# Altium schematic symbol library lib_datalogger.SchLib: 1246 symbols (part 12 of 16) (continued)
## CMP-019-000003-1
designator S?, comment SWITCH TOGGLE 3PST 24A 125V
Manufacturer: E-Switch; Manufacturer Part Number: ST34RE00; Actuator Length: 21.70mm; Illumination: Non-Illuminated; Electrical Life: 6,000 Cycles; Bushing Thread: M12 x 1; Actuator Type: Standard Round; Current Rating: 24A (AC); Actuator Material: Brass, Nickel Plated; Switch Function: On-Off; Mounting Type: Panel Mount; Panel Cutout Dimensions: Circular - 12.00mm Dia; Pricing: 1=8.21, 10=7.992, 25=7.776, 50=7.344, 100=7.128, 250=6.912, 500=5.832, 1000=5.616 (USD); Illumination Type, Color: -; ComponentLink1Description: http://spec_sheets.e-switch.com/specs/34-ST34RE00.pdf; Voltage Rating - AC: 125V; Packaging: Bulk; Category: Switches; Illumination Voltage (Nominal): -; Design Item ID: SWITCH TOGGLE 3PST 24A 125V; Operating Temperature: -20°C ~ 85°C; Features: -; Stock: 1344; Source: mits.SchLib; Voltage Rating - DC: -; Circuit: 3PST; RoHS: RoHS Compliant; ComponentLink1URL: http://spec_sheets.e-switch.com/specs/34-ST34RE00.pdf; Part Status: Active; Ingress Protection: -; Termination Style: Quick Connect - 0.250" (6.3mm)
footprint SWITCH_TOGGLE_3PST_HOLES
footprint SWITCH_TOGGLE_3PST_HOLES
pins: 1, 2, 4, 5, 7, 8

## CMP-019-00003-3
designator U?, comment CAT24C32WI-GT3
I2C CMOS Serial EEPROM, 32 Kb, 1.7 to 5.5 V, -40 to 85 degC, 8-Pin SOIC (751BD), RoHS, Tape and Reel; Manufacturer: ON Semiconductor; Nominal Supply Current: 2mA; Access Time: 3500ns; Clock Frequency: 100kHz; Density: 32Kb; Max Supply Voltage: 5.5V; Frequency: 400kHz; Min Supply Voltage: 1.7V; Package URL: http://www.onsemi.com/pub_link/Collateral/751BD.PDF; Max Operating Temperature: 85°C; Pins: 8; Min Operating Temperature: -40°C; Datasheet URL: http://www.onsemi.com/pub_link/Collateral/CAT24C32-D.PDF; Manufacturer URL: http://www.onsemi.com/; Interface: Serial; Datasheet Version: Rev. 24, 06/2015; RoHS Compliant: True; Max Clock Frequency: 100KHz; Mounting Technology: SM; Package Description: 8-Pin Small Outline Integrated Circuit, Body 4.9 x 3.9 mm, Pitch 1.27 mm; Case/Package: SOIC; Package Reference: SOIC-8-751BD-01; Packaging: TapeandReel; Package Quantity: 3000
footprint ONSC-SOIC-8-751BD-01_L (SOIC, 8-Leads, Body 5x4mm, Pitch 1.27mm, IPC High Density)
footprint ONSC-SOIC-8-751BD-01_N (SOIC, 8-Leads, Body 5x4mm, Pitch 1.27mm, IPC Medium Density)
footprint ONSC-SOIC-8-751BD-01_M (SOIC, 8-Leads, Body 5x4mm, Pitch 1.27mm, IPC Low Density)
pins: 1 A0 (in) "Device Address", 2 A1 (in) "Device Address", 3 A2 (in) "Device Address", 4 VSS (power) "Ground", 5 SDA (io) "Serial Data", 6 SCL (in) "Serial Clock", 7 WP (in) "Write Protect", 8 VCC (power) "Power Supply"

## CMP-019-000004-1
designator S?, comment SWITCH PUSH SPST-NO 1A 120V TH
SWITCH PUSH SPST-NO 1A 120V; Manufacturer Part Number: 800AWSP9M2QE; Manufacturer: E-Switch; Electrical Life: 50,000 Cycles; Color - Actuator/Cap: Black; Ingress Protection: IP67 - Dust Tight, Waterproof; Actuator Type: Round, Plunger; Current Rating: 1A (AC); Switch Function: Off-Mom; Panel Cutout Dimensions: -; Category: Switches; Source: mits.SchLib; Design Item ID: SWITCH PUSH SPST-NO 1A 120V TH; Illumination Voltage (Nominal): -; Operating Temperature: -30°C ~ 85°C; Mounting Type: Through Hole; Voltage Rating - AC: 120V; Stock 1: 6565; ComponentLink1Description: http://spec_sheets.e-switch.com/specs/T833053.pdf; Voltage Rating - DC: -; Termination Style: PC Pin; Pricing 1: 1=2.98, 10=2.778, 25=2.646, 50=2.5138, 100=2.4476, 250=2.3814, 500=2.2491, 1000=2.1168, 5000=1.78605 (USD); RoHS: RoHS Compliant; Circuit: SPST-NO; Illumination Type, Color: -; Features: Epoxy Sealed Terminals; Type: Standard; Mechanical Life: -; ComponentLink1URL: http://spec_sheets.e-switch.com/specs/T833053.pdf; Part Status: Active; Packaging: Bulk
footprint SWITCH_PUSH_TH
footprint SWITCH_PUSH_TH
pins: 1, 2

## CMP-019-00004-3
designator U?, comment S25FL204k0TMFI011
SPI Flash Memory, 2.7 to 3.6 V, -40 to 85 degC, 8-Pin SOIC (SOC 008), RoHS, Tube; Manufacturer: Cypress; Datasheet URL: http://www.cypress.com/file/196871/download; Package Reference: SOIC-8; Datasheet Version: Rev. *G , 09/2015; Package Description: 8-Pin Small Outline Integrated Circuit, Body 5.283 x 5.283 mm, Pitch 1.27 mm; RoHS Compliant: True; Mounting Technology: SM; Manufacturer URL: http://www.cypress.com/; Case/Package: SOIC-8
footprint CYP-SOC-8_N (SOIC, 8-Leads, Body 5.3x5.3mm, Pitch 1.27mm, IPC Medium Density)
footprint CYP-SOC-8_M (SOIC, 8-Leads, Body 5.3x5.3mm, Pitch 1.27mm, IPC Low Density)
footprint CYP-SOC-8_L (SOIC, 8-Leads, Body 5.3x5.3mm, Pitch 1.27mm, IPC High Density)
pins: 1 CS# (in) "Chip Enable", 2 SO (hiz) "Serial Data Output", 3 WP# (in) "Write Protect", 4 GND (power) "Ground", 5 SI/IO0 (io) "Serial Data Input / Output", 6 SCK (in) "Serial Clock Input", 7 HOLD# (in) "Hold Input", 8 VCC (power) "Supply Voltage (2.7-3.6V)"

## CMP-019-000005-1
designator S?, comment SWITCH ROCKER SPST 20A 250V TH
SWITCH ROCKER SPST 20A 250V; Manufacturer Part Number: C1300ARBB-602AW; Manufacturer: Bulgin; Voltage Rating - DC: 24V; Current Rating: 20; Color - Actuator/Cap: Black; Switch Function: On-Off; Actuator Marking: O -; Actuator Type: Concave (Curved); Stock 1: 11242; Features: -; RoHS: RoHS Compliant; Part Status: Active; Electrical Life: -; Mounting Type: Panel Mount, Snap-In; Illumination Voltage (Nominal): -; Design Item ID: SWITCH ROCKER SPST 20A 250V TH; Mechanical Life: -; ComponentLink1URL: http://www.bulgin.com/media/bulgin/data/A_Rocker%201500%201300.pdf; Packaging: Bulk; Source: mits.SchLib; Termination Style: Quick Connect - 0.250" (6.3mm); ComponentLink1Description: http://www.bulgin.com/media/bulgin/data/A_Rocker%201500%201300.pdf; Operating Temperature: -; Category: Switches; Voltage Rating - AC: 250V; Ingress Protection: -; Pricing 1: 1=2.58, 10=2.471, 25=2.3584, 50=2.246, 100=2.1337, 250=2.07756, 500=1.96526, 1000=1.74065, 5000=1.6845 (USD); Circuit: SPST; Panel Cutout Dimensions: Rectangular - 28.60mm x 14.10mm; Illumination Type, Color: -
footprint SWITCH_TOGGLE_TH
footprint ROCKER_HOLES
pins: 1, 2

## CMP-019-00005-3
designator C?, comment L7805ACD2T-TR
Positive Voltage Regulator IC, 5 V, 1.5 A, 0 to 125 degC, 3-Pin D2PAK, RoHS, Tape and Reel; Manufacturer: STMicroelectronics; Package Version: Rev. 1, 11/2014; Min Input Voltage: 7V; Max Ouput Current: 1A; Max Input Voltage: 35V; Output Current: 1.5A; Output Voltage: 5V; Dropout Voltage: 2V; Outputs: 1; Max Supply Voltage: 20V; Min Supply Voltage: 7.5V; Min Operating Temperature: 0°C; RoHS Compliant: True; Package Reference: D2PAK; Mounting Technology: SM; Packaging: TapeandReel; Case/Package: TO-263-3; Manufacturer URL: http://www.st.com/; Pins: 8; Max Operating Temperature: 125°C; Package URL: http://www.st.com/st-web-ui/static/active/en/resource/technical/document/datasheet/DM00122355.pdf; Datasheet URL: http://www.st.com/content/ccc/resource/technical/document/datasheet/41/4f/b3/b0/12/d4/47/88/CD00000444.pdf/files/CD00000444.pdf/jcr:content/translations/en.CD00000444.pdf; Package Quantity: 1000; Package Description: 3-Pin D2PAK, Body 10.2 x 9.15 mm, Pitch 2.54 mm; Datasheet Version: Rev. 34, 11/2016; Nominal Output Voltage: 5V
footprint STM-D2PAK_V (DPAK, 3-Leads, Body 10.2x9.15mm, Pitch 2.54mm)
pins: 1, 2

## CMP-019-000006-1
designator SW?, comment SWITCH ROCKER SPST 20A 250V PANEL  (no BOM)
SWITCH ROCKER SPST 20A 250V; Manufacturer Part Number: C1300ARBB-602AW; Manufacturer: Bulgin; Actuator Marking: O -; Current Rating: 20; Actuator Type: Concave (Curved); Switch Function: On-Off; Color - Actuator/Cap: Black; Voltage Rating - DC: 24V; Packaging: Bulk; Source: mits.SchLib; Part Status: Active; Pricing 1: 1=2.58, 10=2.471, 25=2.3584, 50=2.246, 100=2.1337, 250=2.07756, 500=1.96526, 1000=1.74065, 5000=1.6845 (USD); Category: Switches; Stock 1: 11242; ComponentLink1Description: http://www.bulgin.com/media/bulgin/data/A_Rocker%201500%201300.pdf; Mechanical Life: -; Termination Style: Quick Connect - 0.250" (6.3mm); Ingress Protection: -; Electrical Life: -; Illumination Type, Color: -; RoHS: RoHS Compliant; Circuit: SPST; Design Item ID: SWITCH ROCKER SPST 20A 250V PANEL; Mounting Type: Panel Mount, Snap-In; ComponentLink1URL: http://www.bulgin.com/media/bulgin/data/A_Rocker%201500%201300.pdf; Illumination Voltage (Nominal): -; Features: -; Operating Temperature: -; Panel Cutout Dimensions: Rectangular - 28.60mm x 14.10mm; Voltage Rating - AC: 250V
footprint ROCKER_SWITCH
footprint ROCKER_SWITCH

## CMP-019-00006-3
designator U?, comment LD1117S50TR
Fixed Low Drop Positive Voltage Regulator, 5 V, 0 to 125 degC, 4-Pin SOT223, RoHS, Tape and Reel; Manufacturer: STMicroelectronics; Max Input Voltage: 15V; Min Supply Voltage: 6.5V; Max Ouput Current: 1.3A; Output Voltage: 5V; Output Current: 950mA; Dropout Voltage: 1.1V; Power: 12W; Outputs: 1; Packaging: TapeandReel; Datasheet URL: http://www.st.com/content/ccc/resource/technical/document/datasheet/99/3b/7d/91/91/51/4b/be/CD00000544.pdf/files/CD00000544.pdf/jcr:content/translations/en.CD00000544.pdf; Package Reference: SOT-223; RoHS Compliant: True; Datasheet Version: Nov-13; Min Operating Temperature: 0°C; Case/Package: TO-261-4; Pins: 4; Manufacturer URL: http://www.st.com/; Mounting Technology: SM; Package Quantity: 2500; Nominal Output Voltage: 5V; Max Supply Voltage: 15V; Min Input Voltage: 6.5V; Max Operating Temperature: 125°C; Package Description: 4-Pin Small Outline Transistor, Body 6.5 x 3.5 mm, Pitch 2.3 mm
footprint STM-SOT-223_N (SOT223, 4-Leads, Body 6.7x3.7mm, Pitch 2.3mm, IPC Medium Density)
footprint STM-SOT-223_L (SOT223, 4-Leads, Body 6.7x3.7mm, Pitch 2.3mm, IPC High Density)
footprint STM-SOT-223_M (SOT223, 4-Leads, Body 6.7x3.7mm, Pitch 2.3mm, IPC Low Density)
pins: 1 GND (power), 2 VOUT (power), 3 VIN (power), 4 TAB (power)

## CMP-019-000007-1
designator S?, comment SWITCH ROTARY 3POS 350MA 125V TH
SWITCH ROTARY 3POS 350MA 125V; Manufacturer Part Number: KC56A13.001NPF; Manufacturer: E-Switch; Current Rating: 350mA (AC); Number of Poles per Deck: 1; Number of Positions: 3; Actuator Type: Flatted (6.35mm Dia); Operating Force, Torque: 800 g-cm; Contact Timing: Non-Shorting (BBM); Circuit per Deck: SP3T; Angle of Throw: 90°; Index Stops: Fixed; Actuator Length: 13.00mm; Termination Style: PC Pin; Contact Material: Copper Alloy; Design Item ID: SWITCH ROTARY 3POS 350MA 125V TH; ComponentLink1Description: http://spec_sheets.e-switch.com/specs/G511001.pdf; Number of Decks: 1; Pricing 1: 1=6.59, 10=5.442, 25=5.37, 50=4.9404, 100=4.7256, 250=4.2244, 500=4.1528, 1000=4.0812 (USD); Part Status: Active; ComponentLink1URL: http://spec_sheets.e-switch.com/specs/G511001.pdf; Stock 1: 72; Category: Switches; Mounting Type: Panel Mount, Through Hole; Contact Finish: Gold; Voltage Rating - DC: -; Voltage Rating - AC: 125V; Source: mits.SchLib; Features: -; Depth Behind Panel: 14.20mm; Panel Cutout Dimensions: Circular - 9.80mm Dia; RoHS: RoHS Compliant
footprint ROTARY_SWITCH_SP3T
footprint ROTARY_SWITCH_SP3T
pins: 1, 4 2, 7 3, A COM
1 alternate drawing of the same symbol

## CMP-019-00007-3
designator U?, comment LM2576HVS-5.0/NOPB
SIMPLE SWITCHER(R) Step-Down Regulator, 5 V, 3 A, -40 to 125 degC, 5-Pin TO-263 (TKK), Pb-Free (RoHS Exempt), Tube; Manufacturer: Texas Instruments; Output Current: 3A; Max Supply Voltage: 60V; Efficiency: 77%; Frequency: 58kHz; Min Supply Voltage: 4V; Outputs: 1; Output Voltage: 5V; Mounting Technology: SM; Package Description: 5-Pin Surface Mount Device, Body 10.225 x 9.91 mm, Pitch 1.7 mm; Datasheet URL: http://www.ti.com/lit/ds/symlink/lm2576hv.pdf; Max Operating Temperature: 125°C; Min Operating Temperature: -40°C; Packaging: Rail/Tube; Case/Package: TO-263-5; Max Input Voltage: 60V; Max Ouput Current: 3A; Switching Frequency: 58KHz; Package Quantity: 45; Package Reference: KTT0005B; Min Input Voltage: 4V; Datasheet Version: SNVS107D, 05/2016; Pins: 5; Manufacturer URL: http://www.ti.com/; RoHS Compliant: True
footprint KTT0005B_M (DPAK, 5-Leads, Body 10.65x9.65mm, Pitch 1.7mm, IPC Low Density)
footprint KTT0005B_N (DPAK, 5-Leads, Body 10.65x9.65mm, Pitch 1.7mm, IPC Medium Density)
footprint KTT0005B_L (DPAK, 5-Leads, Body 10.65x9.65mm, Pitch 1.7mm, IPC High Density)
pins: 1 VIN (power) "Supply input pin to collector pin of high-side transistor. Connect to power supply and input bypass capacitors CIN. Path from VIN pin to high frequency bypass CIN and GND must be as short as possible.", 2 OUTPUT (power) "Emitter pin of the power transistor. This is a switching node. Attached this pin to an inductor and the cathode of the external diode.", 3 GROUND (power) "Ground pin. Path to CIN must be as short as possible.", 4 FEEDBACK (in) "Feedback sense input pin. Connect to the midpoint of feedback divider to set VOUT for ADJ version or connect this pin directly to the output capacitor for a fixed output version.", 5 ~{ON}/OFF (in) "Enable input to the voltage regulator. High = OFF and low = ON. Connect to GND to enable the voltage regulator. Do not leave this pin float.", 6 TAB (power) "Connected to GND. Put a copper plane connected to this pin as a thermal relief for DDPAK package."

## CMP-019-000008-1
designator S?, comment SWITCH ROTARY 5POS 350MA 125V TH
SWITCH ROTARY 5POS 350MA 125V; Manufacturer: E-Switch; Manufacturer Part Number: KC15A9.501NPF; Current Rating: 350mA (AC); Contact Timing: Non-Shorting (BBM); Number of Poles per Deck: 1; Operating Force, Torque: 800 g-cm; Actuator Length: 9.50mm; Circuit per Deck: SP5T; Number of Positions: 5; Index Stops: Fixed; Angle of Throw: 30°; Actuator Type: Flatted (6.35mm Dia); Voltage Rating - DC: -; ComponentLink1Description: http://spec_sheets.e-switch.com/specs/G510602.pdf; Features: -; Stock 1: 866; Source: mits.SchLib; ComponentLink1URL: http://spec_sheets.e-switch.com/specs/G510602.pdf; Mounting Type: Panel Mount, Through Hole; Contact Finish: Gold; Design Item ID: SWITCH ROTARY 5POS 350MA 125V TH; Termination Style: PC Pin; Pricing 1: 1=6.59, 10=5.442, 25=5.37, 50=4.9404, 100=4.7256, 250=4.2244, 500=4.1528, 1000=4.0812 (USD); Panel Cutout Dimensions: Circular - 9.80mm Dia; Contact Material: Copper Alloy; Depth Behind Panel: 14.20mm; Number of Decks: 1; Category: Switches; Voltage Rating - AC: 125V; RoHS: RoHS Compliant; Part Status: Active
footprint ROTARY_SWITCH_SP5T
footprint ROTARY_SWITCH_SP5T
pins: 1, 2, 3, 4, 5, A COM
1 alternate drawing of the same symbol

## CMP-019-00008-3
designator U?, comment LMS8117AMP-3.3/NOPB
Low-Dropout Linear Regulator, 1 A, 3.3 V, 0 to 125 degC, 4-Pin SOT223 (DCY), RoHS, Tape and Reel; Manufacturer: Texas Instruments; Min Input Voltage: 2.5V; Min Supply Voltage: 3.2V; Max Supply Voltage: 15V; Outputs: 1; Output Current: 1A; Nominal Supply Current: 5mA; Dropout Voltage: 1.2V; Output Voltage: 3.3V; Datasheet URL: http://www.ti.com/lit/ds/symlink/lms8117a.pdf; Manufacturer URL: http://www.ti.com/; Package Reference: DCY0004A; Max Operating Temperature: 125°C; Datasheet Version: SNOS487F, 05/2004; Max Input Voltage: 15V; Mounting Technology: SM; Package Description: 4-Pin Small Outline Transistor, Body 6.5 x 3.5 mm, Pitch 2.3 mm; Pins: 4; Package Quantity: 1000; Packaging: TapeandReel; RoHS Compliant: True; Min Operating Temperature: 0°C; Case/Package: SOT-223; Max Ouput Current: 1A
footprint DCY0004A_M (SOT223, 4-Leads, Body 6.7x3.7mm, Pitch 2.3mm, IPC Low Density)
footprint DCY0004A_L (SOT223, 4-Leads, Body 6.5x3.5mm, Pitch 2.3mm, IPC High Density)
footprint DCY0004A_N (SOT223, 4-Leads, Body 6.7x3.7mm, Pitch 2.3mm, IPC Medium Density)
pins: 1 GND (power) "Ground pin for fixed output option.", 2 VOUT (power) "Output voltage pin for the regulator", 3 VIN (power) "Input voltage pin for the regulator", 4 VOUT (power) "Output voltage pin for the regulator"

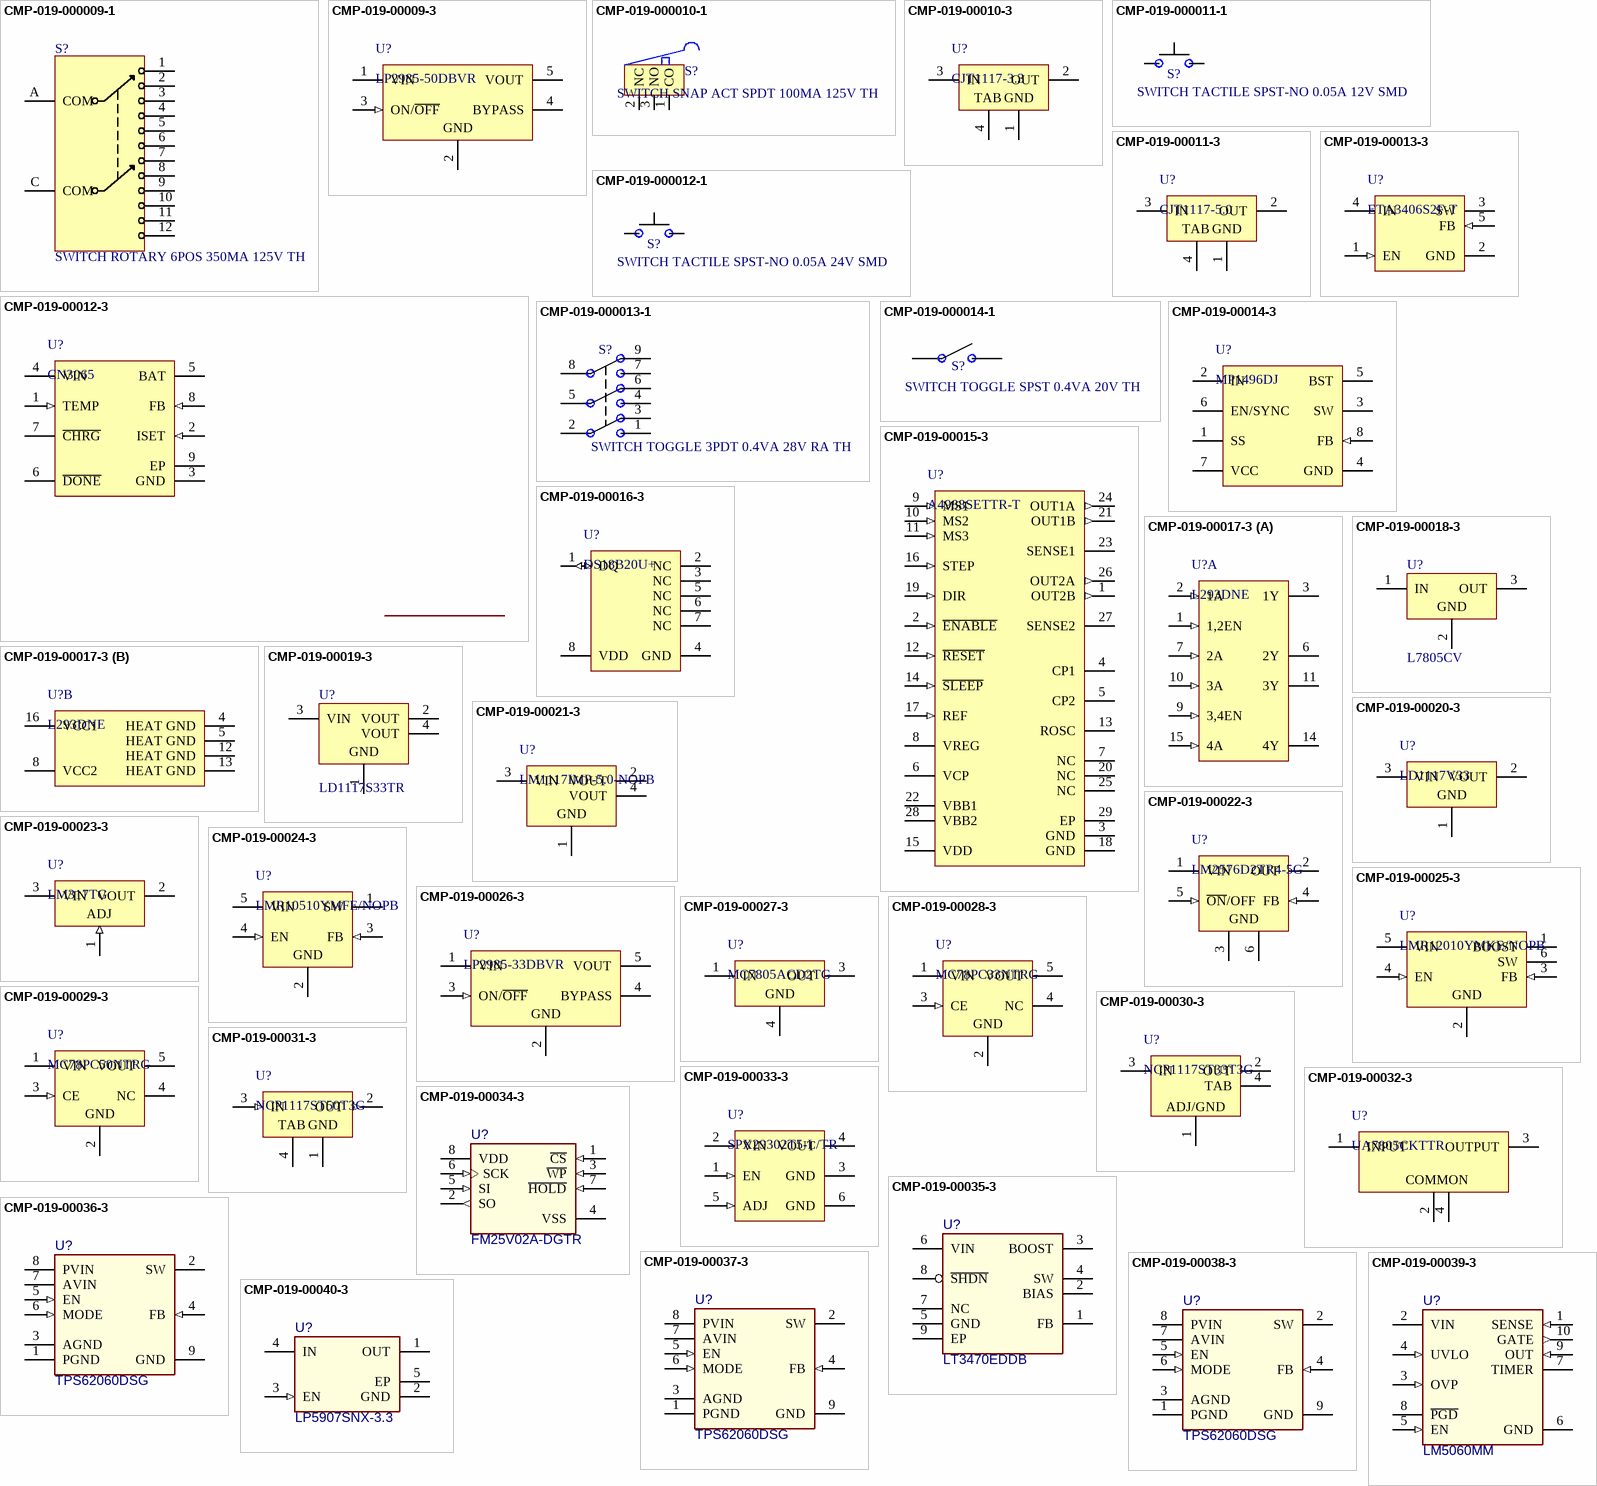
[diagram p35: symbols CMP-019-000009-1 to CMP-019-00040-3]

## CMP-019-000009-1
designator S?, comment SWITCH ROTARY 6POS 350MA 125V TH
SWITCH ROTARY 6POS 350MA 125V; Manufacturer Part Number: KC26A9.501NLS; Manufacturer: E-Switch; Number of Decks: 1; Actuator Length: 9.50mm; Actuator Type: Flatted (6.35mm Dia); Contact Timing: Non-Shorting (BBM); Angle of Throw: 30°; Circuit per Deck: DP6T; Current Rating: 350mA (AC); Index Stops: Fixed; Number of Positions: 6; Number of Poles per Deck: 2; Operating Force, Torque: 800 g-cm; Source: mits.SchLib; Stock 1: 1329; Contact Finish: Silver; RoHS: RoHS Compliant; Features: -; Voltage Rating - AC: 125V; Depth Behind Panel: 18.50mm; Panel Cutout Dimensions: Circular - 9.80mm Dia; ComponentLink1Description: http://spec_sheets.e-switch.com/specs/G523729.pdf; Termination Style: Solder Lug; Mounting Type: Panel Mount; Design Item ID: SWITCH ROTARY 6POS 350MA 125V TH; ComponentLink1URL: http://spec_sheets.e-switch.com/specs/G523729.pdf; Part Status: Active; Category: Switches; Voltage Rating - DC: -; Contact Material: Copper Alloy; Pricing 1: 1=5.5, 10=5.269, 25=4.8112, 50=4.582, 100=4.1238, 250=3.78016, 500=3.6656, 1000=3.55105 (USD)
footprint ROTARY_SWITCH_DP6T
footprint ROTARY_SWITCH_DP6T
pins: 1, 2, 3, 4, 5, 6, 7, 8, 9, 10, 11, 12, A COM, C COM
1 alternate drawing of the same symbol

## CMP-019-00009-3
designator U?, comment LP2985-50DBVR
Low-Noise Low-Dropout Regulator with Shutdown, 150 mA, Fixed 5 V Output, 2.2 to 16 V Input, 5-Pin SOT-23 (DBV), -40 to 125 degC, Green (RoHS & no Sb/Br), Tape and Reel; Manufacturer: Texas Instruments; Outputs: 1; Nominal Output Voltage: 5V; Min Input Voltage: 2.2V; Output Current: 150mA; Max Input Voltage: 16V; Dropout Voltage: 280mV; Manufacturer URL: http://www.ti.com/; Package Description: 5-Pin Small Outline Transistor, Body 2.9 x 1.6 mm, Pitch 0.95 mm; Min Operating Temperature: -40°C; Package URL: http://www.ti.com/lit/ml/mpds018l/mpds018l.pdf; Package Quantity: 1; Datasheet URL: http://www.ti.com/lit/ds/symlink/lp2985.pdf; Pins: 8; Datasheet Version: SLVS522O, 01/2015; Package Reference: DBV0005A; Case/Package: SOT-23-5; Max Operating Temperature: 125°C; Mounting Technology: SM; Output Voltage: 5V; RoHS Compliant: True; Max Ouput Current: 150mA; Packaging: TapeandReel
footprint DBV0005A_M (SOT23, 5-Leads, Body 3.05x1.75mm, Pitch 0.95mm, IPC Low Density)
footprint DBV0005A_N (SOT23, 5-Leads, Body 3.05x1.75mm, Pitch 0.95mm, IPC Medium Density)
footprint DBV0005A_L (SOT23, 5-Leads, Body 3.05x1.75mm, Pitch 0.95mm, IPC High Density)
pins: 1 VIN (power) "Input Voltage", 2 GND (power) "Common Ground (device substrate)", 3 ON/~{OFF} (in) "Logic high enable input", 4 BYPASS "Bypass capacitor for low noise operation", 5 VOUT (power) "Regulated output voltage"

## CMP-019-000010-1
designator S?, comment SWITCH SNAP ACT SPDT 100MA 125V TH
SWITCH SNAP ACT SPDT 100MA 125V; Manufacturer: Omron Electronics Inc-EMC Div; Manufacturer Part Number: D2HW-BL231DL; Switch Function: On-Mom; Actuator Type: Lever, Simulated Roller; Operating Force, Torque: 66gf; Electrical Life: 100,000 Cycles; Current Rating: 100mA (AC), 2A (DC); Mechanical Life: 1,000,000 Cycles; Ingress Protection: IP67 - Dust Tight, Waterproof; Differential Travel: 0.020" (0.5mm); Operating Position: 0.440" (11.2mm); Voltage Rating - DC: 12V; Overtravel: 0.075" (1.9mm); Release Force: 5gf; RoHS: RoHS Compliant; ComponentLink1URL: http://www.omron.com/ecb/products/pdf/en-d2hw.pdf; Category: Switches; Termination Style: PC Pin; Voltage Rating - AC: 125V; Operating Temperature: -40°C ~ 85°C; Mounting Type: Through Hole, Right Angle; Source: mits.SchLib; Circuit: SPDT; Part Status: Active; Pricing 1: 1=3.42, 10=3.155, 25=2.9576, 50=2.892, 100=2.3004, 250=2.16892, 500=2.03748, 1000=1.90603, 2500=1.8403 (USD); Packaging: Bulk; Features: Support Posts; ComponentLink1Description: http://www.omron.com/ecb/products/pdf/en-d2hw.pdf; Pretravel: -; Stock 1: 684; Design Item ID: SWITCH SNAP ACT SPDT 100MA 125V TH
footprint SNAP_SWITCH_D2HW
footprint SNAP_SWITCH_D2HW
pins: 1 CO, 2 NC, 3 NO

## CMP-019-00010-3
designator U?, comment CJT1117-3.3
Low Dropout Linear Regulator, 1 A, 3.3 V, 0 to 125 degC, 4-Pin SOT223, RoHS, Tape and Reel; Manufacturer: Jiangsu Changjiang Electronics Technology; Package Description: 4-Pin Small Outline Transistor, Body 6.3 x 3.5 mm, Pitch 2.3 mm; Package URL: http://www.cj-elec.com/gallery/txUpfile/2013626129718915.pdf; Package Reference: SOT223-4; Datasheet URL: https://statics3.seeedstudio.com/images/opl/datasheet/1310190P1.pdf; Mounting Technology: SM; Datasheet Version: Rev. A, 01/2012; RoHS Compliant: Unknown; Case/Package: SOT223-4
footprint JSCJ-SOT223-4_L (SOT223, 4-Leads, Body 6.4x3.7mm, Pitch 2.3mm, IPC High Density)
footprint JSCJ-SOT223-4_N (SOT223, 4-Leads, Body 6.4x3.7mm, Pitch 2.3mm, IPC Medium Density)
footprint JSCJ-SOT223-4_M (SOT223, 4-Leads, Body 6.4x3.7mm, Pitch 2.3mm, IPC Low Density)
pins: 1 GND (power), 2 OUT (power), 3 IN (power), 4 TAB

## CMP-019-000011-1
designator S?, comment SWITCH TACTILE SPST-NO 0.05A 12V SMD
Switch Tactile N.O. SPST Rectangular Button J-Lead 0.05A 12VDC 2.55N SMD T/R; Manufacturer Part Number: TL3302BF260QJ; Manufacturer: E-Switch; Current Rating: 50mA; Operating Force: 260gf; Switch Travel: 0.25mm; Switch Function: Off-Mom; Actuator Material: Polyphenylene; Mechanical Life: 30000Cycles; Illumination Type: Non-Illuminated; ComponentLink1URL: https://datasheet.ciiva.com/2900/p020333b-2900880.pdf?src-supplier=Digi-Key; Design Item ID: SWITCH TACTILE SPST-NO 0.05A 12V SMD; Min Operating Temperature: -20°C; RoHS Compliant: Yes; Voltage Rating (DC): 12V; ComponentLink1Description: https://datasheet.ciiva.com/2900/p020333b-2900880.pdf?src-supplier=Digi-Key; Size: 11.4mm; Package Quantity: 1; Contact Plating: Silver; Lead Free: Lead Free; Termination: Gull Wing; Series: TL3302; Mount: Surface Mount; RoHS: Yes; Category: Tactile Switches; Stock 1: 19576; Throw Configuration: SPST; Packaging: Tape and Reel; Pricing 1: 1=0,82000, 10=0,79300, 25=0,74120, 100=0,64360, 250=0,58564, 500=0,54294 (USD); Source: mits.SchLib; Max Operating Temperature: 70°C
footprint SWITCH_TACTILE_SMD_2PIN
pins: 1, 2

## CMP-019-00011-3
designator U?, comment CJT1117-5.0
Low Dropout Linear Regulator, 1 A, 5 V, 0 to 125 degC, 4-Pin SOT223, RoHS, Tape and Reel; Manufacturer: Jiangsu Changjiang Electronics Technology; RoHS Compliant: Unknown; Mounting Technology: SM; Package Reference: SOT223-4; Case/Package: SOT223-4; Datasheet URL: https://statics3.seeedstudio.com/images/opl/datasheet/1310190P1.pdf; Package Description: 4-Pin Small Outline Transistor, Body 6.3 x 3.5 mm, Pitch 2.3 mm; Package URL: http://www.cj-elec.com/gallery/txUpfile/2013626129718915.pdf; Datasheet Version: Rev. A, 01/2012
footprint JSCJ-SOT223-4_L (SOT223, 4-Leads, Body 6.4x3.7mm, Pitch 2.3mm, IPC High Density)
footprint JSCJ-SOT223-4_N (SOT223, 4-Leads, Body 6.4x3.7mm, Pitch 2.3mm, IPC Medium Density)
footprint JSCJ-SOT223-4_M (SOT223, 4-Leads, Body 6.4x3.7mm, Pitch 2.3mm, IPC Low Density)
pins: 1 GND (power), 2 OUT (power), 3 IN (power), 4 TAB

## CMP-019-000012-1
designator S?, comment SWITCH TACTILE SPST-NO 0.05A 24V SMD
SWITCH TACTILE SPST-NO 0.05A 24V; Manufacturer Part Number: 1571625-1; Manufacturer: TE Connectivity ALCOSWITCH Switches; Actuator Type: Standard; Contact Rating @ Voltage: 0.05A @ 24VDC; Illumination: Non-Illuminated; Actuator Material: Thermoplastic; Operating Force: 50gf; Switch Function: Off-Mom; Actuator Height off PCB, Vertical: 2.50mm; Actuator Orientation: Top Actuated; Mechanical Life: 2,000,000 Cycles; Outline: 6.20mm x 6.20mm; Switch Travel: 0.20mm; Termination Style: J Lead; Source: mits.SchLib; Features: -; Stock 1: 30000; Illumination Type, Color: -; Category: Switches; Circuit: SPST-NO; RoHS: RoHS Compliant; ComponentLink1Description: http://www.te.com/commerce/DocumentDelivery/DDEController?Action=srchrtrv&DocNm=1571625&DocType=Customer+Drawing&DocLang=English; ComponentLink1URL: http://www.te.com/commerce/DocumentDelivery/DDEController?Action=srchrtrv&DocNm=1571625&DocType=Customer+Drawing&DocLang=English; Design Item ID: SWITCH TACTILE SPST-NO 0.05A 24V SMD; Actuator Length, Right Angle: -; Mounting Type: Surface Mount; Ingress Protection: -; Pricing 1: 1=0.35, 10=0.336, 25=0.324, 50=0.312, 100=0.3, 250=0.276, 500=0.24, 1000=0.204, 5000=0.171 (USD); Packaging: Bulk; Illumination Voltage (Nominal): -; Operating Temperature: -35°C ~ 85°C; Part Status: Active
footprint SWITCH_TACTILE_SMD
footprint SWITCH_TACTILE_SMD
pins: 1, 2, 3, 4

## CMP-019-00012-3
designator U?, comment CN3065
Lithium Ion Battery Charger for Solar-Powered System, 4.4 to 6 V, 650 uA, -40 to 85 degC, 8-Pin DFN, RoHS; Manufacturer: Consonance Electronic; RoHS Compliant: Unknown; Package Reference: DFN-8; Datasheet URL: http://www.consonance-elec.com/pdf/datasheet/DSE-CN3065.pdf; Manufacturer URL: http://www.consonance-elec.com/; Datasheet Version: Rev. 1.0, 09/2009; Mounting Technology: SM; Case/Package: DFN-8; Package Description: 8-Pin Small Outline No-lead Package, Body 3 x 3 mm, Pitch 0.5 mm
footprint CONS-DFN-8_M (SON, 8-Leads, Body 3.1x3.1mm, Pitch 0.5mm, Thermal Pad 2.4x1.7mm, IPC Low Density)
footprint CONS-DFN-8_N (SON, 8-Leads, Body 3.1x3.1mm, Pitch 0.5mm, Thermal Pad 2.4x1.7mm, IPC Medium Density)
footprint CONS-DFN-8_L (SON, 8-Leads, Body 3.10x3.10mm, Pitch 0.50mm, Thermal Pad 2.40x1.7mm, IPC High Density)
pins: 1 TEMP (in) "Temperature Sense Input. Connecting TEMP pin to NTC thermistor’s output in Lithium ion battery pack. If TEMP pin’s voltage is below 46% of input supply voltage VIN for more than 0.15S, this means that batter(See Datasheet)", 2 ISET (in) "Constant Charge Current Setting and Charge Current Monitor Pin. The charge current is set by connecting a resistor RISET from this pin to GND. When in precharge mode, the ISET pin’s voltage is regulated to 0.2V. When i(See Datasheet)", 3 GND (power) "Ground Terminal.", 4 VIN (power) "Positive Input Supply Voltage. VIN is the power supply to the internal circuit. When VIN drops to within 40mv of the BAT pin voltage, CN3065 enters low power sleep mode, dropping BAT pin’s current to less than 3uA.", 5 BAT (power) "Battery Connection Pin. Connect the positive terminal of the battery to BAT pin. BAT pin draws less than 3uA current in chip disable mode or in sleep mode. BAT pin provides charge current to the battery and provides (See Datasheet)", 6 ~{DONE} (hiz) "Open-Drain Charge termination Status Output. In charge termination status, D\O\N\E\ is pulled low by an internal switch; Otherwise D\O\N\E\ pin is in high impedance state.", 7 ~{CHRG} (hiz) "Open Drain Charge Status Output. When the battery is being charged, the C\H\R\G\  pin is pulled low by an internal switch, otherwise C\H\R\G\ pin is in high impedance state.", 8 FB (in) "Battery Voltage Kevin Sense Input. This Pin can Kelvin sense the battery voltage; Also the regulation voltage in constant voltage mode can be adjusted by connecting an external resistor between FB pin and BAT pin.", 9 EP

## CMP-019-000013-1
designator S?, comment SWITCH TOGGLE 3PDT 0.4VA 28V RA TH
SWITCH TOGGLE 3PDT 0.4VA 28V; Manufacturer: NKK Switches; Manufacturer Part Number: M2032S2A2G40; Switch Function: On-On; Actuator Material: Brass, Chrome Plated; Illumination: Non-Illuminated; Bushing Thread: Unthreaded; Electrical Life: 50,000 Cycles; Actuator Length: 6.86mm; Current Rating: 0.4VA (AC/DC); Actuator Type: Standard Round; Category: Switches; Stock 1: 521; Design Item ID: SWITCH TOGGLE 3PDT 0.4VA 28V RA TH; Illumination Voltage (Nominal): -; RoHS: RoHS Compliant; Voltage Rating - DC: 28V; Voltage Rating - AC: 28V; Packaging: Bulk; Illumination Type, Color: -; Source: mits.SchLib; Operating Temperature: -30°C ~ 85°C; Pricing 1: 1=10.03, 10=9.768, 25=9.504, 50=8.976, 100=8.712, 250=8.448, 500=7.128, 1000=6.864 (USD); Circuit: 3PDT; Ingress Protection: -; Features: Epoxy Sealed Terminals; ComponentLink1URL: http://www.nkk.com/documents/products/toggle/m/MTogglesAnglePC.pdf; Panel Cutout Dimensions: -; ComponentLink1Description: http://www.nkk.com/documents/products/toggle/m/MTogglesAnglePC.pdf; Termination Style: PC Pin; Part Status: Active; Mounting Type: Through Hole, Right Angle, Vertical
footprint SWITCH_TOGGLE_3PDT
footprint SWITCH_TOGGLE_3PDT
pins: 1, 2, 3, 4, 5, 6, 7, 8, 9

## CMP-019-00013-3
designator U?, comment ETA3406S2F-T
Step-Down Converter, 1.5 MHz, 1.2 A, 2.6 to 6 VIN, -40 to 85 degC, 5-Pin SOT23, RoHS; Manufacturer: ETA solution; Datasheet URL: http://datasheet.octopart.com/ETA3406S2F-T-ETA-Solutions-datasheet-62330933.pdf; Package Reference: SOT23-5; Package Description: 5-Pin Small Outline Transistor, Body 2.9 x 1.65 mm, Pitch 0.95 mm; Datasheet Version: Apr-13; Manufacturer URL: http://www.etasolution.com/; Case/Package: SOT23-5; Mounting Technology: SM; RoHS Compliant: Unknown
footprint ETA-SOT23-5_N (SOT23, 5-Leads, Body 3.1x1.8mm, Pitch 0.95mm, IPC Medium Density)
footprint ETA-SOT23-5_M (SOT23, 5-Leads, Body 3.1x1.8mm, Pitch 0.95mm, IPC Low Density)
footprint ETA-SOT23-5_L (SOT23, 5-Leads, Body 3.1x1.8mm, Pitch 0.95mm, IPC High Density)
pins: 1 EN (in) "Enable pin for the IC. Drive this pin to high to enable the part, low to disable.", 2 GND (power) "Ground", 3 SW (power) "Inductor Connection. Connect an inductor Between SW and the regulator output.", 4 IN (power) "Supply Voltage. Bypass with a 10uF ceramic capacitor to GND", 5 FB (in) "Feedback Input. Connect an external resistor divider from the output to FB and GND to set the output to a voltage between 0.6V and VIN"

## CMP-019-000014-1
designator S?, comment SWITCH TOGGLE SPST 0.4VA 20V TH
SWITCH TOGGLE SPST 0.4VA 20V; Manufacturer Part Number: TMS6T5B2M2RE; Manufacturer: TE Connectivity ALCOSWITCH Switches; Illumination: Non-Illuminated; Bushing Thread: Unthreaded; Actuator Length: 7.62mm; Actuator Type: Standard Round; Switch Function: On-Off; Current Rating: 0.4VA (AC/DC); Features: Process Sealed; Illumination Voltage (Nominal): -; Pricing 1: 1=5.25, 10=4.997, 25=4.872, 50=4.7472, 100=4.6223, 250=4.24756, 500=3.74784, 1000=3.37306 (USD); Ingress Protection: -; ComponentLink1Description: http://www.te.com/commerce/DocumentDelivery/DDEController?Action=srchrtrv&DocNm=2267078&DocType=Customer+Drawing&DocLang=English; Electrical Life: -; RoHS: RoHS Compliant; Voltage Rating - AC: 20V; Mounting Type: Through Hole; Category: Switches; Circuit: SPST; Voltage Rating - DC: 20V; Panel Cutout Dimensions: -; Termination Style: PC Pin; Packaging: Bulk; Actuator Material: -; Illumination Type, Color: -; Stock 1: 642; Design Item ID: SWITCH TOGGLE SPST 0.4VA 20V TH; Operating Temperature: -30°C ~ 85°C; Part Status: Active; Source: mits.SchLib; ComponentLink1URL: http://www.te.com/commerce/DocumentDelivery/DDEController?Action=srchrtrv&DocNm=2267078&DocType=Customer+Drawing&DocLang=English
footprint SWITCH_TOGGLE_TH
footprint SWITCH_TOGGLE_TH
pins: 1, 2

## CMP-019-00014-3
designator U?, comment MP1496DJ
High-Efficiency, Synchronous, Step-Down Converter, 2 A, 16 V, 500 KHz, -40 to 125 degC, 8-Pin TSOT23, RoHS, Tape and Reel; Manufacturer: Monolithic Power Systems; Package Reference: TSOT23-8; Datasheet URL: http://www.monolithicpower.com/DesktopModules/DocumentManage/API/Document/getDocument?id=443; RoHS Compliant: Unknown; Mounting Technology: SM; Case/Package: TSOT23-8; Manufacturer URL: http://www.monolithicpower.com/; Package Description: 8-Pin Small Outline Package Integrated Circuit, Body 1.6 x 2.9 mm, Pitch 0.65 mm; Datasheet Version: Rev. 1.05, 12/2012
footprint MPS-TSOT23-8_V (SOP, 8-Leads, Body 3x1.7mm, Pitch 0.65mm)
pins: 1 SS "Soft-Start. Connect an external capacitor to program the soft start time for the switch mode regulator.", 2 IN (power) "Supply Voltage. The MP1496 operates from a 4.5V-to-16V input rail. C1 decouples the input rail. Use wide PCB trace to make the connection.", 3 SW "Switch Output. Connect using a wide PCB trace.", 4 GND (power) "System Ground. Reference ground of the regulated output voltage. Use special care in PCB layout: Connect to GND with copper and vias.", 5 BST "Bootstrap. Connect a capacitor between SW and BST pins to form a floating supply across the high-side switch driver. A 10ohm resistor placed between SW and BST cap. is strongly recommended to reduce SW spike voltage.", 6 EN/SYNC "Enable/Synchronize. EN high to enable the MP1496. Apply an external clock to EN/SYNC pin to change the switching frequency", 7 VCC (power) "Bias Supply. Decouple with 0.1uF-to-0.22uF cap. The capacitance should not exceed 0.22uF. VCC capacitor should be put closely to VCC pin and GND pin.", 8 FB (in) "Feedback. Connect to the tap of an external resistor divider from the output to GND to set the output voltage. The frequency fold-back comparator lowers the oscillator frequency when the FB voltage is below 400mV to prevent (See Datasheet)"

## CMP-019-00015-3
designator U?, comment A4988SETTR-T
DMOS Microstepping Driver with Translator and Overcurrent Protection, 3 to 5.5 V, -20 to 85 degC, 28-Pin QFN (ET), RoHS, Tape and Reel; Manufacturer: Allegro Microsystems; Output Voltage: 35V; Max Supply Voltage: 5V; Min Supply Voltage: 3V; Outputs: 1; Output Current: 2A; Max Operating Temperature: 85°C; Package Quantity: 1500; Packaging: TapeandReel; Pins: 28; RoHS Compliant: True; Datasheet Version: Rev. 6, 01/2016; Min Operating Temperature: -20°C; Mounting Technology: SM; Datasheet URL: http://www.allegromicro.com/en/Products/Part_Numbers/4988/4988.pdf; Package Reference: ET28; Manufacturer URL: http://www.allegromicro.com/; Case/Package: QFN; Package Description: 28-Pin Quad Flat No-lead Package, Body 5.15 x 5.15 mm, Pitch 0.5 mm
footprint ALEG-ET-28_V (QFN, 28-Leads, Body 5.15x5.15mm, Pitch 0.5mm, Thermal Pad 3.15x3.15mm)
pins: 1 OUT2B (out) "DMOS Full Bridge 2 Output B", 2 ~{ENABLE} (in) "Logic input", 3 GND (power) "Ground", 4 CP1 "Charge pump capacitor terminal", 5 CP2 "Charge pump capacitor terminal", 6 VCP "Reservoir capacitor terminal", 7 NC "No connection", 8 VREG "Regulator decoupling terminal", 9 MS1 (in) "Logic input", 10 MS2 (in) "Logic input", 11 MS3 (in) "Logic input", 12 ~{RESET} (in) "Logic input", 13 ROSC "Timing set", 14 ~{SLEEP} (in) "Logic input", 15 VDD (power) "Logic supply", 16 STEP (in) "Logic input", 17 REF (in) "Gm reference voltage input", 18 GND (power) "Ground", 19 DIR (in) "Logic input", 20 NC "No connection", 21 OUT1B (out) "DMOS Full Bridge 1 Output B", 22 VBB1 (power) "Load supply", 23 SENSE1 "Sense resistor terminal for Bridge 1", 24 OUT1A (out) "DMOS Full Bridge 1 Output A", 25 NC "No connection", 26 OUT2A (out) "DMOS Full Bridge 2 Output A", 27 SENSE2 "Sense resistor terminal for Bridge 2", 28 VBB2 (power) "Load supply", 29 EP (power) "Exposed pad for enhanced thermal dissipation"

## CMP-019-00016-3
designator U?, comment DS18B20U+
Programmable Resolution 1-Wire Digital Thermometer, -55 to 125 degC, 8-Pin SOP, RoHS, Tube; Manufacturer: Maxim; Interface: Serial; Max Supply Voltage (DC): 5V; Min Supply Voltage (DC): 3V; Nominal Supply Current: 1mA; Output Current: 4mA; Max Supply Voltage: 5.5V; Datasheet Version: Rev. 4, 01/2015; Package URL: http://pdfserv.maximintegrated.com/package_dwgs/21-0036.PDF; RoHS Compliant: True; Packaging: Rail/Tube; Datasheet URL: http://datasheets.maximintegrated.com/en/ds/DS18B20.pdf; Package Reference: U8+1; Case/Package: MSOP; Mounting Technology: SM; Min Operating Temperature: -55°C; Package Quantity: 50; Package Description: 8-Pin Small Outline Package Integrated Circuit, Body 3 x 3 mm, Pitch 0.65 mm; Max Operating Temperature: 125°C; Min Supply Voltage: 3V; Pins: 8; Manufacturer URL: http://www.maximintegrated.com/
footprint MAXM-U8+1_V (SOP, 8-Leads, Body 3.1x3.1mm, Pitch 0.65mm)
pins: 1 DQ (io) "Data Input/Output. Open-drain 1-Wire interface pin. Also provides power to the device when used in parasite power mode (see the Powering the DS18B20 section.)", 2 NC "No Connection", 3 NC "No Connection", 4 GND (power) "Ground", 5 NC "No Connection", 6 NC "No Connection", 7 NC "No Connection", 8 VDD (power) "Optional VDD. VDD must be grounded for operation in parasite power mode."

## CMP-019-00017-3
designator U?, comment L293DNE
Quadruple Half-H Driver, 1.2 A Peak, 4.5 to 36 V, 0 to 70 degC, 16-Pin DIP (NE), Pb-Free (RoHS), Tube; Manufacturer: Texas Instruments; Interface: Parallel; Package Version: 4040054/B, 04/1995; Outputs: 4; Min Supply Voltage: 4.5V; Max Supply Voltage: 36V; Output Current: 600mA; Manufacturer URL: http://www.ti.com/; Package Reference: NE0016A; Min Operating Temperature: 0°C; Package Quantity: 25; Datasheet Version: SLRS008D, 01/2016; Packaging: Rail/Tube; Case/Package: DIP; Package Description: 16-Pin Through Hole Device, Body 19.8 x 6.35 mm, Pitch 2.54 mm, Row Spacing 7.62 mm; Package URL: http://www.ti.com/lit/ml/mpdi003/mpdi003.pdf; Max Operating Temperature: 70°C; RoHS Compliant: True; Mounting Technology: TH; Datasheet URL: http://www.ti.com/general/docs/lit/getliterature.tsp?genericPartNumber=l293d&fileType=pdf; Output Voltage: 36V; Pins: 16
footprint NE0016A (DIP, 16-Leads, Body 19.8x6.6mm, Pitch 2.54mm, Row Spacing 7.62mm)
part A pins: 1 1,2EN (in), 2 1A (in), 3 1Y (hiz), 6 2Y (hiz), 7 2A (in), 9 3,4EN (in), 10 3A (in), 11 3Y (hiz), 14 4Y (hiz), 15 4A (in)
part B pins: 4 HEAT GND (power), 5 HEAT GND (power), 8 VCC2 (power), 12 HEAT GND (power), 13 HEAT GND (power), 16 VCC1 (power)

## CMP-019-00018-3
designator U?, comment L7805CV
Positive Voltage Regulator IC, 1.5 A, 5 V, 0 to 125 degC, 3-Pin TO-220, RoHS, Tube; Manufacturer: STMicroelectronics; Max Input Voltage: 35V; Min Supply Voltage: 8V; Nominal Output Voltage: 5V; Outputs: 1; Output Current: 1.5A; Dropout Voltage: 2V; Max Supply Voltage: 20V; Min Input Voltage: 7V; Datasheet Version: Rev 30, 09/2012; Min Operating Temperature: 0°C; Manufacturer URL: http://www.st.com/; Pins: 3; Mounting Technology: TH; Output Voltage: 5V; RoHS Compliant: True; Max Ouput Current: 1.5A; Datasheet URL: https://datasheet.ciiva.com/15111/getdatasheetpartid-44136-15111027.pdf; Packaging: Rail/Tube; Max Operating Temperature: 125°C; Case/Package: TO-220; Package Quantity: 50
footprint TO220 (TO, Thru-Hole, Vertical, Heatsink Mounted; 3 In-Line Leads; Pitch 2.54 mm)
pins: 1 IN (power), 2 GND (power), 3 OUT (power)

## CMP-019-00019-3
designator U?, comment LD1117S33TR
Low Drop Positive Voltage Regulator, 800 mA, Fixed 3.3 V Output, 0 to 125 degC, 3-Pin TO-220, RoHS, Tape and Reel; Manufacturer: STMicroelectronics; Max Supply Voltage: 15V; Dropout Voltage: 1.1V; Power: 12W; Output Current: 950mA; Min Input Voltage: 4.75V; Nominal Output Voltage: 3.3V; Max Ouput Current: 1.3A; Outputs: 1; Packaging: TapeandReel; Datasheet Version: Rev. 33, 11/2013; RoHS Compliant: True; Mounting Technology: SM; Max Input Voltage: 15V; Max Operating Temperature: 125°C; Package Reference: SOT-223; Package Quantity: 2500; Package Description: 4-Pin Small Outline Transistor, Body 6.5 x 3.5 mm, Pitch 2.3 mm; Case/Package: TO-261-4; Min Operating Temperature: 0°C; Datasheet URL: http://www.farnell.com/datasheets/1776449.pdf; Min Supply Voltage: 4.75V; Pins: 3; Output Voltage: 3.3V; Manufacturer URL: http://www.st.com/
footprint STM-SOT-223_N (SOT223, 4-Leads, Body 6.7x3.7mm, Pitch 2.3mm, IPC Medium Density)
footprint STM-SOT-223_L (SOT223, 4-Leads, Body 6.7x3.7mm, Pitch 2.3mm, IPC High Density)
footprint STM-SOT-223_M (SOT223, 4-Leads, Body 6.7x3.7mm, Pitch 2.3mm, IPC Low Density)
pins: 1 GND (power), 2 VOUT (power), 3 VIN (power), 4 VOUT (power)

## CMP-019-00020-3
designator U?, comment LD1117V33
Low Drop Positive Voltage Regulator, 800 mA, Fixed 3.3 V Output, 0 to 125 degC, 3-Pin TO-220, RoHS, Tube; Manufacturer: STMicroelectronics; Max Supply Voltage: 15V; Max Ouput Current: 800mA; Output Voltage: 3.3V; Power: 12W; Min Supply Voltage: 4.75V; Output Current: 1.3A; Outputs: 1; Min Input Voltage: 4.4V; Dropout Voltage: 1.1V; Datasheet Version: Rev. A, 07/2003; Case/Package: TO-220-3; Package Quantity: 50; Max Input Voltage: 15V; Manufacturer URL: http://www.st.com/; Min Operating Temperature: 0°C; Datasheet URL: http://www.farnell.com/datasheets/1776449.pdf; Max Operating Temperature: 125°C; Nominal Output Voltage: 3.3V; RoHS Compliant: True; Pins: 3; Packaging: Rail/Tube
footprint STM-TO220-3 (FM, 3-Leads, Body 10.4x4.6mm, Pitch 2.55mm)
pins: 1 GND (power), 2 VOUT (power), 3 VIN (power)

## CMP-019-00021-3
designator U?, comment LM1117IMP-5.0-NOPB
Low-Dropout Linear Regulator, 800 mA, -40 to 125 degC, 4-Pin SOT-223 (DCY), Green (RoHS & no Sb/Br), Tape and Reel; Manufacturer: Texas Instruments; Dropout Voltage: 1.2V; Nominal Output Voltage: 5V; Max Ouput Current: 800mA; Outputs: 1; Min Input Voltage: 2.6V; Max Input Voltage: 15V; Manufacturer URL: http://www.ti.com/; Max Operating Temperature: 125°C; Packaging: TapeandReel; RoHS Compliant: True; Output Voltage: 5V; Pins: 4; Package Description: 4-Pin Small Outline Transistor, Body 6.5 x 3.5 mm, Pitch 2.3 mm; Min Operating Temperature: -40°C; Mounting Technology: SM; Output Current: 800mA; Case/Package: SOT-223; Datasheet Version: SNOS412N, 01/2016; Datasheet URL: http://www.ti.com/lit/ds/symlink/lm1117.pdf; Package Reference: DCY0004A
footprint DCY0004A_M (SOT223, 4-Leads, Body 6.7x3.7mm, Pitch 2.3mm, IPC Low Density)
footprint DCY0004A_L (SOT223, 4-Leads, Body 6.5x3.5mm, Pitch 2.3mm, IPC High Density)
footprint DCY0004A_N (SOT223, 4-Leads, Body 6.7x3.7mm, Pitch 2.3mm, IPC Medium Density)
pins: 1 GND (power) "Ground pin for fixed output option.", 2 VOUT (power) "Output voltage pin for the regulator", 3 VIN (power) "Input voltage pin for the regulator", 4 VOUT (power) "Output voltage pin for the regulator"

## CMP-019-00022-3
designator U?, comment LM2576D2TR4-5G
Step-Down Switching Regulator, 3 A, 5 V, -40 to 125 degC, 5-Pin D2PAK (936A-02), RoHS, Tape and Reel; Manufacturer: ON Semiconductor; Min Input Voltage: 7V; Output Voltage: 5V; Frequency: 52kHz; Outputs: 1; Efficiency: 77%; Output Current: 3A; Max Input Voltage: 45V; Package Description: 5-Pin Transistor Outline, Body 10.02 x 9.1945 mm, Pitch 1.702 mm; Mounting Technology: SM; Min Operating Temperature: -40°C; RoHS Compliant: True; Package Quantity: 800; Datasheet Version: Rev. 8, 01/2006; Package Reference: D2PAK-5-936A-02; Manufacturer URL: http://www.onsemi.com/; Datasheet URL: http://www.onsemi.com/pub_link/Collateral/LM2576-D.PDF; Max Ouput Current: 3A; Max Operating Temperature: 125°C; Packaging: TapeandReel; Case/Package: TO-263-6
footprint ONSC-D2PAK-5-936A-02_V (DPAK, 5-Leads, Body 10.02x9.194mm, Pitch 1.702mm)
pins: 1 VIN (power) "This pin is the positive input supply for the LM2576 step-down switching regulator. In order to minimize voltage transients and to supply the switching currents needed by the regulator, a suitable input bypass capacitor must (See Datasheet)", 2 OUT (power) "This is the emitter of the internal switch. The saturation voltage Vsat of this output switch is typically 1.5 V. It should be kept in mind that the PCB area connected to this pin should be kept to a minimum in order to (See Datasheet)", 3 GND (power) "Circuit ground pin. See the information about the printed circuit board layout.", 4 FB (in) "This pin senses regulated output voltage to complete the feedback loop. The signal is divided by the internal resistor divider network R2, R1 and applied to the non-inverting input of the internal error amplifier. In the (See Datasheet)", 5 ~{ON}/OFF (in) "It allows the switching regulator circuit to be shut down using logic level signals, thus dropping the total input supply current to approximately 80 uA. The input threshold voltage is typically 1.4 V. Applying a voltage (See Datasheet)", 6 GND (power) "Heatsink surface (shown as terminal 6 in case outline drawing) is connected to Pin 3"

## CMP-019-00023-3
designator U?, comment LM317TG
Adjustable Output, Positive Voltage Regulator, 1.5 A, 0 to 125 degC, 3-Pin TO-220 (221AB-01), Pb-Free, Rail; Manufacturer: ON Semiconductor; Outputs: 1; Max Input Voltage: 40V; Min Input Voltage: 4.2V; Output Current: 1.5A; Output Voltage: 1.2V; Package Version: Rev. A, 11/2010; Mounting Technology: TH; Case/Package: TO-220; Package Description: 3-Pin Flange Mount, Vertical Straight Lead, Body 9.97 x 4.445 mm, Pitch 2.54 mm; Package Reference: TO-220-3-221AB-01; Manufacturer URL: http://www.onsemi.com/; Package Quantity: 50; Datasheet Version: Rev. 14, 01/2016; Max Ouput Current: 1.5A; Min Operating Temperature: 0°C; Packaging: Rail/Tube; Datasheet URL: http://www.onsemi.com/pub_link/Collateral/LM317-D.PDF; Max Operating Temperature: 125°C; RoHS Compliant: True; Pins: 3
footprint ONSC-TO-220-3-221AB-01 (FM, 3-Leads, Body 10.3x4.85mm, Pitch 2.54mm)
pins: 1 ADJ (in), 2 VOUT (power), 3 VIN (power)

## CMP-019-00024-3
designator U?, comment LMR10510YMFE/NOPB
Simple Switcher, Step-Down Voltage Regulator, 3 to 5.5 V Input, 1 A, 0.6 to 4.5 V Output, -40 to 125 degC, 5-Pin SOT-23 (DBV), Green (RoHS & no Sb/Br), Tape and Reel; Manufacturer: Texas Instruments; Max Ouput Current: 1A; Max Input Voltage: 5.5V; Outputs: 1; Min Input Voltage: 3V; Switching Frequency: 3MHz; Output Voltage: 4.5V; Case/Package: SOT-23-5; Pins: 5; Min Operating Temperature: -40°C; Package Description: 5-Pin Small Outline Transistor, Body 2.9 x 1.6 mm, Pitch 0.95 mm; Package Quantity: 250; Package Reference: DBV0005A; Datasheet URL: http://www.ti.com/lit/ds/symlink/lmr10510.pdf; Frequency: 3MHz; Mounting Technology: SM; Manufacturer URL: http://www.ti.com/; Datasheet Version: SNVS727B, 04/2013; Max Operating Temperature: 125°C; Packaging: TapeandReel; Output Current: 1A; Package URL: http://www.ti.com/lit/ml/mpds018l/mpds018l.pdf; RoHS Compliant: True
footprint DBV0005A_M (SOT23, 5-Leads, Body 3.05x1.75mm, Pitch 0.95mm, IPC Low Density)
footprint DBV0005A_N (SOT23, 5-Leads, Body 3.05x1.75mm, Pitch 0.95mm, IPC Medium Density)
footprint DBV0005A_L (SOT23, 5-Leads, Body 3.05x1.75mm, Pitch 0.95mm, IPC High Density)
pins: 1 SW (power) "Switch node. Connect to the inductor, output diode.", 2 GND (power) "Signal and power ground pin. Place the bottom resistor of the feedback network as close as possible to this pin.", 3 FB (in) "Feedback pin. Connect FB to external resistor divider to set output voltage.", 4 EN (in) "Shutdown control input. Logic high enables operation. Do not allow this pin to float or be greater than VIN + 0.3V.", 5 VIN (power) "input supply voltage."